# Altium footprint library PcbLib1.PcbLib: 34 footprints (part 1 of 3)
Each footprint in its own frame and in the unit in brackets; x right, y up, seen from the top. Pads: shape width x height; smd on the part's side, far side on the other; paste and mask are expansions set on the pad; w line width, h text height; cw(c..) or ccw(c..) is an arc to the next point about the centre after c.
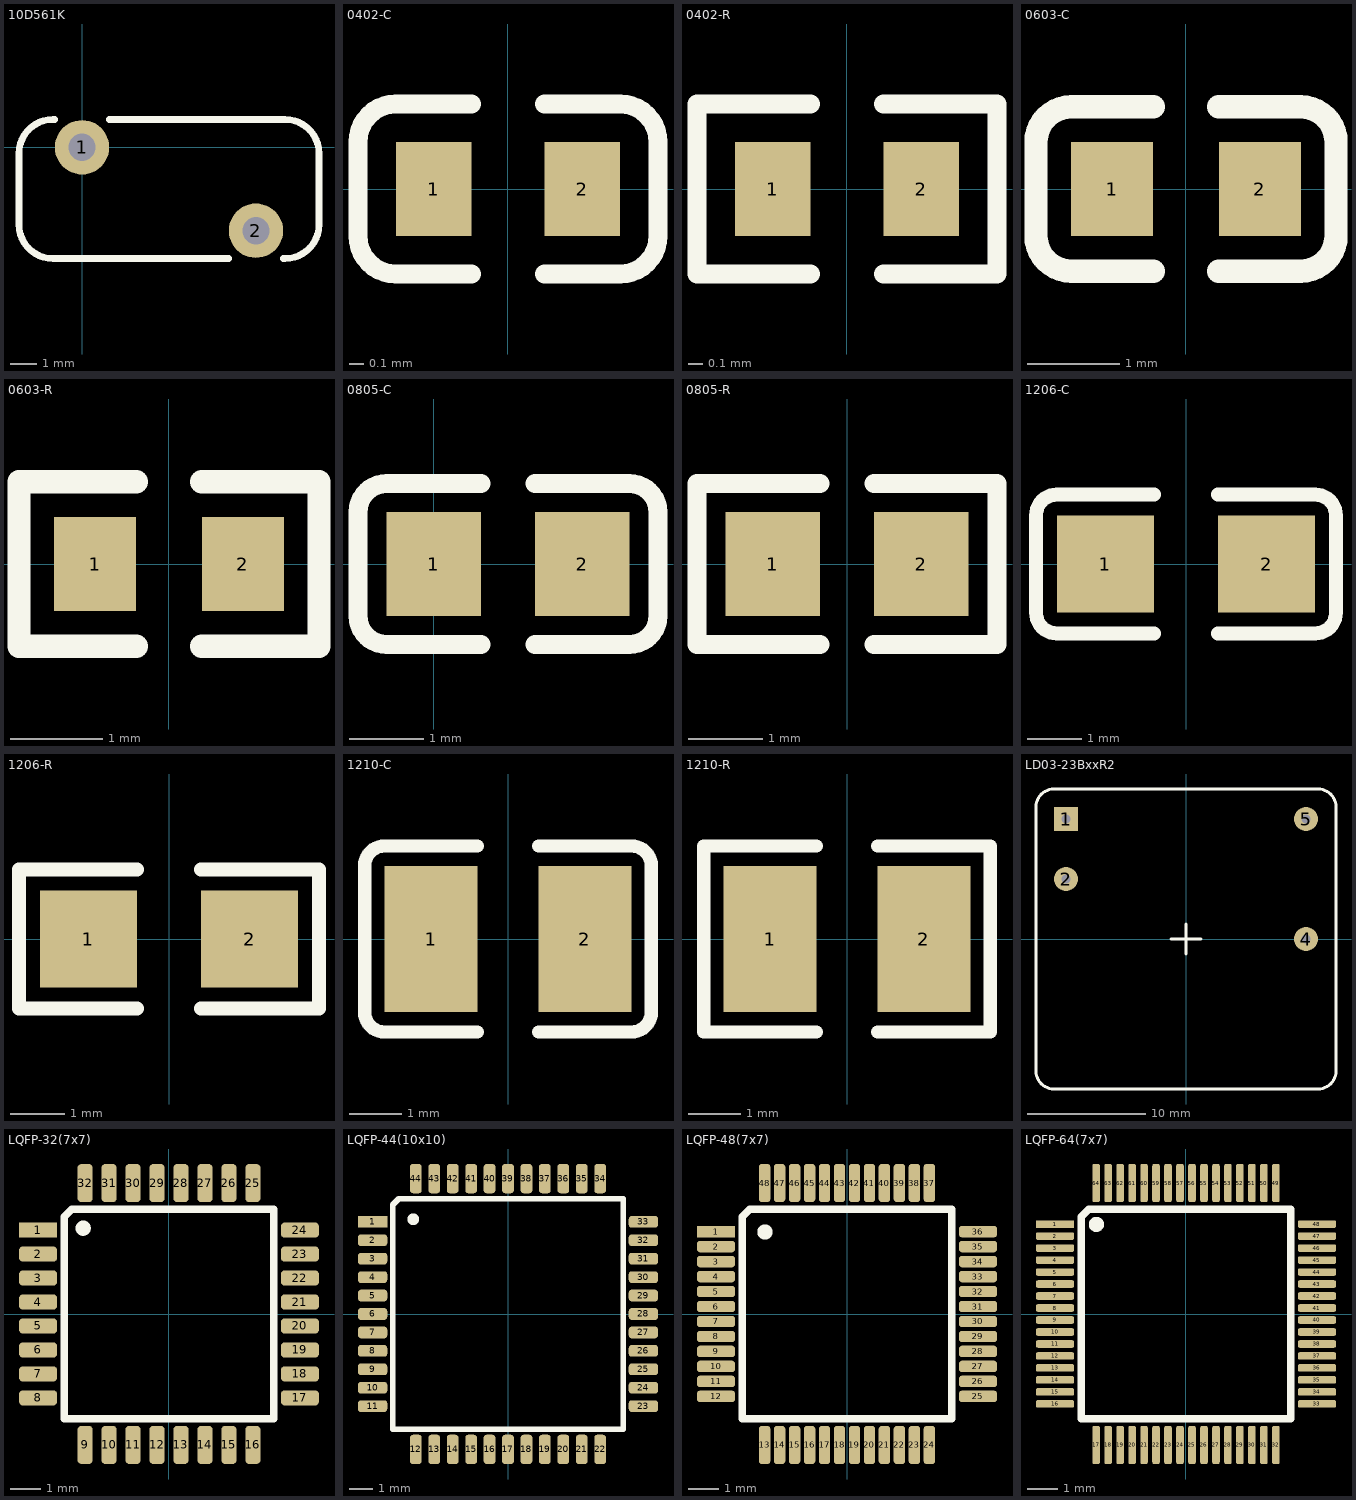
[diagram p0: the footprints below, top view; thin cyan lines are the x and y axes]

## 10D561K [mil]
pads (2):
  round 80 hole 40: 1(0,0) 2(255.66,-122.44)
Top Overlay:
  lines w10: -40,41.14 -42.64,41.14 ccw(c-42.64,-8.86) -92.64,-8.86 -92.64,-113.58 ccw(c-42.64,-113.58) -42.64,-163.58 215.66,-163.58 ; 40,41.14 298.3,41.14 cw(c298.3,-8.86) 348.3,-8.86 348.3,-113.58 cw(c298.3,-113.58) 298.3,-163.58 295.66,-163.58

## 0402-C [mil]
pads (2):
  rect 20x25 smd: 1(-19.68,0) 2(19.69,0)
Top Overlay:
  lines w5: -9.69,-22.5 -29.68,-22.5 cw(c-29.68,-12.5) -39.69,-12.5 -39.69,12.5 cw(c-29.68,12.5) -29.68,22.5 -9.69,22.5 ; 9.69,-22.5 29.69,-22.5 ccw(c29.69,-12.5) 39.69,-12.5 39.69,12.5 ccw(c29.69,12.5) 29.69,22.5 9.69,22.5
3D body "0402-C.step": height 22.01, standoff 0, extent -22.01,-12.01 22.01,12.01

## 0402-R [mil]
pads (2):
  rect 20x25 smd: 1(-19.68,0) 2(19.69,0)
Top Overlay:
  lines w5: -9.69,-22.5 -39.69,-22.5 -39.69,22.5 -9.69,22.5 ; 9.69,-22.5 39.69,-22.5 39.69,22.5 9.69,22.5
3D body "0402-R.step": height 15.98, standoff 0, extent -20.98,-10.98 20.98,10.98

## 0603-C [mil]
pads (2):
  rect 35x40 smd: 1(-31.5,0) 2(31.5,0)
Top Overlay:
  lines w10: -14,-35 -49,-35 cw(c-49,-20) -64,-20 -64,20 cw(c-49,20) -49,35 -14,35 ; 14,-35 49,-35 ccw(c49,-20) 64,-20 64,20 ccw(c49,20) 49,35 14,35
3D body "0603-C.step": height 30, standoff 0, extent -31.5,-15 31.5,15

## 0603-R [mil]
pads (2):
  rect 35x40 smd: 1(-31.5,0) 2(31.5,0)
Top Overlay:
  lines w10: -14,-35 -64,-35 -64,35 -14,35 ; 14,-35 64,-35 64,35 14,35
3D body "0603-R.step": height 32.99, standoff 0, extent -34.84,-18.7 34.84,18.7

## 0805-C [mil]
pads (2):
  rect 50x55 smd: 1(0,0) 2(78.74,0)
Top Overlay:
  lines w10: 25,-42.5 -25,-42.5 cw(c-25,-27.5) -40,-27.5 -40,27.5 cw(c-25,27.5) -25,42.5 25,42.5 ; 53.74,-42.5 103.74,-42.5 ccw(c103.74,-27.5) 118.74,-27.5 118.74,27.5 ccw(c103.74,27.5) 103.74,42.5 53.74,42.5
3D body "0805-C.step": height 49.02, standoff 0, extent -0.63,-25 79.37,25

## 0805-R [mil]
pads (2):
  rect 50x55 smd: 1(-39.37,0) 2(39.37,0)
Top Overlay:
  lines w10: -14.37,-42.5 -79.37,-42.5 -79.37,42.5 -14.37,42.5 ; 14.37,-42.5 79.37,-42.5 79.37,42.5 14.37,42.5
3D body "0805-R.step": height 27.99, standoff 0, extent -39.37,-23.62 39.37,23.62

## 1206-C [mil]
pads (2):
  rect 70x70 smd: 1(-57.99,0) 2(57.99,0)
Top Overlay:
  lines w10: -22.99,-50 -92.99,-50 cw(c-92.99,-35) -107.99,-35 -107.99,35 cw(c-92.99,35) -92.99,50 -22.99,50 ; 22.99,-50 92.99,-50 ccw(c92.99,-35) 107.99,-35 107.99,35 ccw(c92.99,35) 92.99,50 22.99,50
3D body "1206-C.step": height 37.01, standoff 0, extent -67.01,-35.51 67.01,35.51

## 1206-R [mil]
pads (2):
  rect 70x70 smd: 1(-57.99,0) 2(57.99,0)
Top Overlay:
  lines w10: -22.99,-50 -107.99,-50 -107.99,50 -22.99,50 ; 22.99,-50 107.99,-50 107.99,50 22.99,50
3D body "1206-R.step": height 27.99, standoff 0, extent -62.99,-31.5 62.99,31.5

## 1210-C [mil]
pads (2):
  rect 70x110 smd: 1(-57.99,0) 2(57.99,0)
Top Overlay:
  lines w10: -22.99,-70 -92.99,-70 cw(c-92.99,-55) -107.99,-55 -107.99,55 cw(c-92.99,55) -92.99,70 -22.99,70 ; 22.99,-70 92.99,-70 ccw(c92.99,-55) 107.99,-55 107.99,55 ccw(c92.99,55) 92.99,70 22.99,70
3D body "1210-C.step": height 27.99, standoff 0, extent -67.01,-52.99 67.01,52.99

## 1210-R [mil]
pads (2):
  rect 70x110 smd: 1(-57.99,0) 2(57.99,0)
Top Overlay:
  lines w10: -22.99,-70 -107.99,-70 -107.99,70 -22.99,70 ; 22.99,-70 107.99,-70 107.99,70 22.99,70
3D body "1210-R.step": height 27.99, standoff 0, extent -62.99,-49.21 62.99,49.21

## LD03-23BxxR2 [mil]
pads (4):
  rect 80x80 hole 30: 1(-400,400)
  round 80 hole 30: 2(-400,200) 4(400,0) 5(400,400)
Top Overlay:
  lines w10: -50,0 50,0 ; 0,-50 0,50 ; -500,-440 ccw(c-440,-440) -440,-500 440,-500 ccw(c440,-440) 500,-440 500,440 ccw(c440,440) 440,500 -440,500 ccw(c-440,440) -500,440 -500,-440
3D body "LD03-23BxxR2.stp": height 696.85, standoff -161.42, extent -500,-500 500,500

## LQFP-32(7x7) [mil]
pads (32):
  rect 50x20 smd: 1(-172.17,110.24)
  rrect50% 50x20 smd: 2(-172.17,78.74) 3(-172.17,47.24) 4(-172.17,15.75) 5(-172.17,-15.75) 6(-172.17,-47.24) 7(-172.17,-78.74) 8(-172.17,-110.24) 17(172.17,-110.24) 18(172.17,-78.74) 19(172.17,-47.24) 20(172.17,-15.75) 21(172.17,15.75) 22(172.17,47.24) 23(172.17,78.74) 24(172.17,110.24)
  rrect50% 20x50 smd: 9(-110.24,-172.16) 10(-78.74,-172.16) 11(-47.24,-172.16) 12(-15.75,-172.16) 13(15.75,-172.16) 14(47.24,-172.16) 15(78.74,-172.16) 16(110.24,-172.16) 25(110.24,172.16) 26(78.74,172.16) 27(47.24,172.16) 28(15.75,172.16) 29(-15.75,172.16) 30(-47.24,172.16) 31(-78.74,172.16) 32(-110.24,172.16)
Top Overlay:
  circle w10: c-112.8,112.8 r5
  lines w10: -137.8,-137.8 -137.8,127.8 -127.8,137.8 137.79,137.8 137.79,-137.8 -137.8,-137.8
3D body "LQFP-32(7x7).step": height 63.11, standoff 0, extent -177.01,-177.01 177.01,177.01

## LQFP-44(10x10) [mil]
pads (44):
  rect 50x20 smd: 1(-231.22,157.48)
  rrect50% 50x20 smd: 2(-231.22,125.98) 3(-231.22,94.49) 4(-231.22,62.99) 5(-231.22,31.5) 6(-231.22,0) 7(-231.22,-31.5) 8(-231.22,-62.99) 9(-231.22,-94.49) 10(-231.22,-125.98) 11(-231.22,-157.48) 23(231.22,-157.48) 24(231.22,-125.98) 25(231.22,-94.49) 26(231.22,-62.99) 27(231.22,-31.5) 28(231.22,0) 29(231.22,31.5) 30(231.22,62.99) 31(231.22,94.49) 32(231.22,125.98) 33(231.22,157.48)
  rrect50% 20x50 smd: 12(-157.48,-231.22) 13(-125.98,-231.22) 14(-94.49,-231.22) 15(-62.99,-231.22) 16(-31.5,-231.22) 17(0,-231.22) 18(31.5,-231.22) 19(62.99,-231.22) 20(94.49,-231.22) 21(125.98,-231.22) 22(157.48,-231.22) 34(157.48,231.22) 35(125.98,231.22) 36(94.49,231.22) 37(62.99,231.22) 38(31.5,231.22) 39(0,231.22) 40(-31.5,231.22) 41(-62.99,231.22) 42(-94.49,231.22) 43(-125.98,231.22) 44(-157.48,231.22)
Top Overlay:
  circle w10: c-161.85,161.85 r5
  lines w10: -196.85,-196.85 -196.85,186.85 -186.85,196.85 196.85,196.85 196.85,-196.85 -196.85,-196.85
3D body "LQFP-44(10x10).step": height 63.11, standoff 0, extent -240,-240 240,240

## LQFP-48(7x7) [mil]
pads (48):
  rect 50x15 smd: 1(-172.16,108.27)
  rrect50% 50x15 smd: 2(-172.16,88.58) 3(-172.16,68.9) 4(-172.16,49.21) 5(-172.16,29.53) 6(-172.16,9.84) 7(-172.16,-9.84) 8(-172.16,-29.53) 9(-172.16,-49.21) 10(-172.16,-68.9) 11(-172.16,-88.58) 12(-172.16,-108.27) 25(172.16,-108.27) 26(172.16,-88.58) 27(172.16,-68.9) 28(172.16,-49.21) 29(172.16,-29.53) 30(172.16,-9.84) 31(172.16,9.84) 32(172.16,29.53) 33(172.16,49.21) 34(172.16,68.9) 35(172.16,88.58) 36(172.16,108.27)
  rrect50% 15x50 smd: 13(-108.27,-172.16) 14(-88.58,-172.16) 15(-68.9,-172.16) 16(-49.21,-172.16) 17(-29.53,-172.16) 18(-9.84,-172.16) 19(9.84,-172.16) 20(29.53,-172.16) 21(49.21,-172.16) 22(68.9,-172.16) 23(88.58,-172.16) 24(108.27,-172.16) 37(108.27,172.16) 38(88.58,172.16) 39(68.9,172.16) 40(49.21,172.16) 41(29.53,172.16) 42(9.84,172.16) 43(-9.84,172.16) 44(-29.53,172.16) 45(-49.21,172.16) 46(-68.9,172.16) 47(-88.58,172.16) 48(-108.27,172.16)
Top Overlay:
  circle w10: c-107.8,107.8 r5
  lines w10: -137.8,-137.8 137.8,-137.8 137.8,137.8 -127.8,137.8 -137.8,127.8 -137.8,-137.8
3D body "LQFP-48(7x7).step": height 63.11, standoff 0, extent -177.05,-177.05 177.05,177.05

## LQFP-64(7x7) [mil]
pads (64):
  rect 50x10 smd: 1(-172.16,118.11)
  rrect50% 50x10 smd: 2(-172.16,102.36) 3(-172.16,86.61) 4(-172.16,70.87) 5(-172.16,55.12) 6(-172.16,39.37) 7(-172.16,23.62) 8(-172.16,7.87) 9(-172.16,-7.87) 10(-172.16,-23.62) 11(-172.16,-39.37) 12(-172.16,-55.12) 13(-172.16,-70.87) 14(-172.16,-86.61) 15(-172.16,-102.36) 16(-172.16,-118.11) 33(172.17,-118.11) 34(172.17,-102.36) 35(172.17,-86.61) 36(172.17,-70.86) 37(172.17,-55.12) 38(172.17,-39.37) 39(172.17,-23.62) 40(172.17,-7.87) 41(172.17,7.88) 42(172.17,23.62) 43(172.17,39.37) 44(172.17,55.12) 45(172.17,70.87) 46(172.17,86.61) 47(172.17,102.36) 48(172.17,118.11)
  rrect50% 10x50 smd: 17(-118.11,-172.16) 18(-102.36,-172.16) 19(-86.61,-172.16) 20(-70.87,-172.16) 21(-55.12,-172.16) 22(-39.37,-172.16) 23(-23.62,-172.16) 24(-7.87,-172.16) 25(7.87,-172.16) 26(23.62,-172.16) 27(39.37,-172.16) 28(55.12,-172.16) 29(70.87,-172.16) 30(86.61,-172.16) 31(102.36,-172.16) 32(118.11,-172.16) 49(118.11,172.17) 50(102.36,172.17) 51(86.61,172.17) 52(70.87,172.17) 53(55.12,172.17) 54(39.37,172.17) 55(23.62,172.17) 56(7.87,172.17) 57(-7.87,172.17) 58(-23.62,172.17) 59(-39.37,172.17) 60(-55.12,172.17) 61(-70.87,172.17) 62(-86.61,172.17) 63(-102.36,172.17) 64(-118.11,172.17)
Top Overlay:
  circle w10: c-117.8,117.8 r5
  lines w10: -137.8,-137.8 137.8,-137.8 137.8,137.8 -127.8,137.8 -137.8,127.8 -137.8,-137.8
3D body "LQFP-64(7x7).step": height 63.11, standoff 0, extent -180.98,-180.98 180.98,180.98